# Altium footprint library MyPcbLib.PcbLib: 657 footprints (part 8 of 42)
Each footprint in its own frame and in the unit in brackets; x right, y up, seen from the top. Pads: shape width x height; smd on the part's side, far side on the other; paste and mask are expansions set on the pad; w line width, h text height; cw(c..) or ccw(c..) is an arc to the next point about the centre after c.
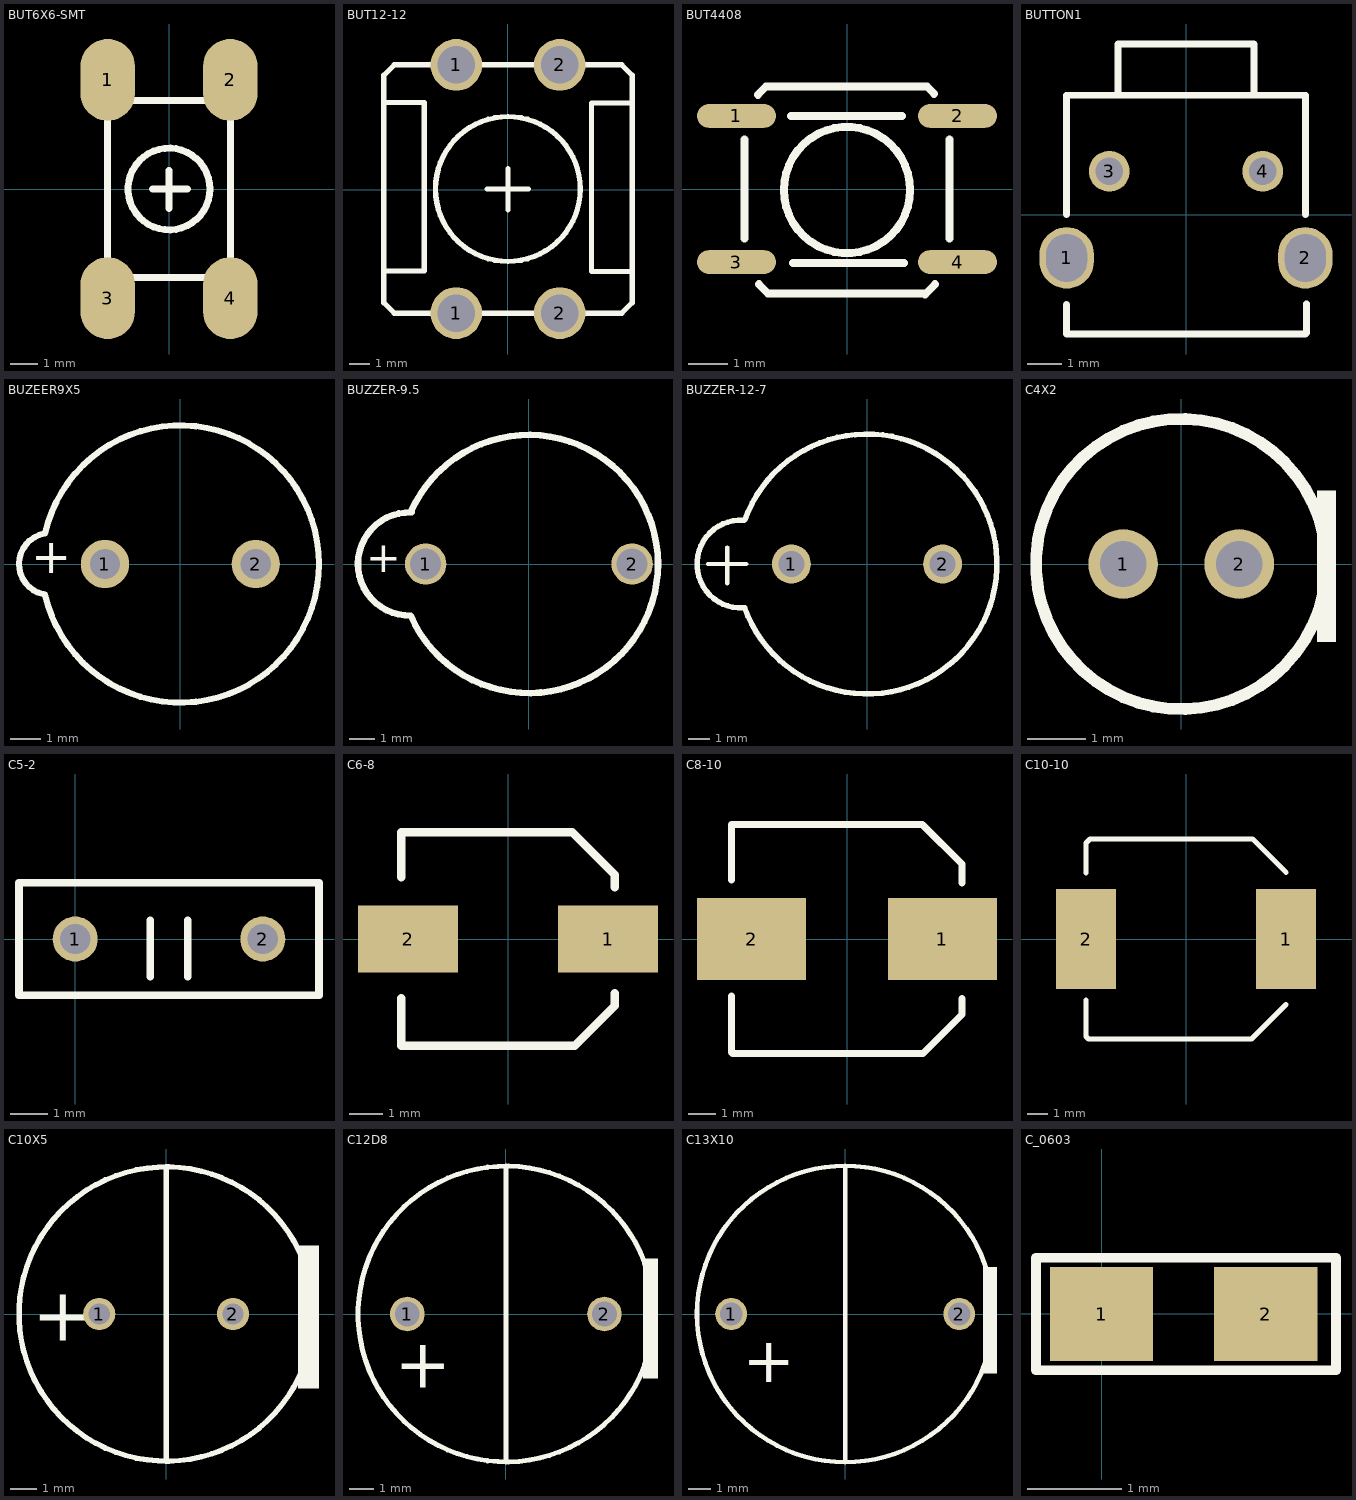
[diagram p7: the footprints below, top view; thin cyan lines are the x and y axes]

## BUT6X6-SMT [mm]
pads (4):
  oval 2x3 smd: 1(-2.25,4) 2(2.25,4) 3(-2.25,-4) 4(2.25,-4)
Top Overlay:
  circle w0.254: c0,0 r1.5
  lines w0.254: -0.599,0 0.671,0 ; 0,-0.71 0,0.687 ; -2.25,-3.25 -2.25,3.25 2.25,3.25 2.25,-3.25 -2.25,-3.25

## BUT12-12 [mm]
pads (4):
  round 2.5 hole 1.8: 1(-2.49,-5.97) 1(-2.49,6.03) 2(2.51,-5.97) 2(2.51,6.03)
Top Overlay:
  circle w0.254: c0.004,0.03 r3.5
  lines w0.254: -5.99,-3.938 -4.034,-3.938 -4.034,4.216 -5.939,4.216 -5.99,4.266 ; -0.996,0.025 0.004,0.025 ; 0.004,-0.975 0.004,0.025 ; 0.004,1.025 0.004,0.025 ; 1.004,0.025 0.004,0.025 ; 5.959,-3.963 4.043,-3.963 4.043,4.19 5.959,4.19 ; -5.99,-5.47 -5.49,-5.97 5.51,-5.97 6.01,-5.47 6.01,5.53 5.51,6.03 -5.49,6.03 -5.99,5.53 -5.99,-5.47
3D body: height 15.25, standoff -1.75, extent -5.949,-5.994 6.051,6.006

## BUT4408 [mm]
pads (4):
  oval 2x0.6 smd: 1(-2.8,1.85) 2(2.8,1.85) 3(-2.8,-1.85) 4(2.8,-1.85)
Top Overlay:
  circle w0.203: c0,-0.025 r1.6
  lines w0.203: -2.6,-1.25 -2.6,1.25 ; -2.261,2.388 -2.057,2.591 ; -2.235,-2.413 -2.007,-2.642 ; -2,-2.651 2,-2.651 ; -2,2.6 2,2.6 ; -1.422,1.854 1.397,1.854 ; -1.372,-1.88 1.448,-1.88 ; 1.981,-2.667 2.235,-2.413 ; 2.032,2.591 2.21,2.413 ; 2.6,-1.25 2.6,1.25

## BUTTON1 [mm]
pads (4):
  oval 1.6x1.8 hole 1.2 slot 1.4 at 90 deg: 1(-3.5,-1.27) 2(3.5,-1.27)
  round 1.2 hole 0.8: 3(-2.25,1.27) 4(2.25,1.27)
Top Overlay:
  lines w0.203: -3.505,-3.5 -3.505,-2.642 ; -3.5,-3.5 3.5,-3.5 ; -3.5,0 -3.5,3.5 3.5,3.5 3.5,0 ; -2,3.5 -2,5 2,5 2,3.519 ; 3.531,-3.48 3.531,-2.616
3D body: height 6, standoff -3, extent -2.949,0.334 3.051,5.334

## BUZEER9X5 [mm]
pads (2):
  round 1.6 hole 1: 1(-2.5,0) 2(2.5,0)
Top Overlay:
  lines w0.203: -4.549,-1.001 cw(c-4.327,0) -4.52,1.008 ; -4.485,-1.022 ccw(c0,0) -4.486,1.019
  text "+" at -4.953,-0.686 h2
3D body: height 5.05, standoff -1.6, extent -4.424,-4.403 4.576,4.597

## BUZZER-9.5 [mm]
pads (2):
  round 1.6 hole 1.2: 1(-4,0) 2(4,0)
Top Overlay:
  lines w0.254: -4.582,2.001 cw(c0,0) -4.575,-2.016 ; -4.572,-1.999 cw(c-4.623,0) -4.547,1.999
  text "+" at -6.299,-0.711 h2

## BUZZER-12-7 [mm]
pads (2):
  round 1.8 hole 1.2: 1(-3.5,0) 2(3.5,0)
Top Overlay:
  lines w0.203: -7.366,0 -5.588,0 ; -6.477,-0.889 -6.477,0.762
  lines w0.254: -5.722,-2.032 cw(c-5.842,0) -5.715,2.032 ; -5.676,-2.018 ccw(c0,0) -5.661,2.059
3D body: height 10.05, standoff -4, extent -6.076,-5.969 5.924,6.031

## C4X2 [mm]
pads (2):
  round 1.2 hole 0.8: 1(-1,0) 2(1,0)
Top Overlay:
  circle w0.203: c0,0 r2.5
  rectangle: 2.337,-1.346 2.667,1.27

## C5-2 [mm]
pads (2):
  round 1.2 hole 0.8: 1(0,0) 2(5,0)
Top Overlay:
  lines w0.203: 2,-1 2,0.5 ; 3,-1 3,0.5 ; -1.5,-1.5 -1.5,1.5 6.5,1.5 6.5,-1.5 -1.5,-1.5

## C6-8 [mm]
pads (2):
  rect 3x2 smd: 1(3,0) 2(-3,0)
Top Overlay:
  lines w0.254: -3.2,-3.2 2.007,-3.2 3.2,-2.007 ; -3.2,-3.175 -3.2,-1.778 ; -3.2,1.854 -3.2,3.15 ; -3.2,3.2 1.931,3.2 3.2,1.931 3.2,1.549 ; 3.2,-1.956 3.2,-1.626

## C8-10 [mm]
pads (2):
  rect 4x3 smd: 1(3.5,0) 2(-3.5,0)
Top Overlay:
  lines w0.254: -4.242,-4.166 -4.242,-2.083 ; -4.242,2.159 -4.242,4.191 ; -4.2,-4.2 2.785,-4.2 4.216,-2.769 ; -4.2,4.2 2.76,4.2 4.216,2.743 ; 4.216,-2.743 4.216,-2.184 ; 4.216,2.057 4.216,2.718

## C10-10 [mm]
pads (2):
  rect 3x5 smd: 1(5,0) 2(-5,0)
Top Overlay:
  lines w0.254: -5,-3.048 -5,-4.881 -4.881,-5 3.28,-5 5,-3.28 ; -5,3.302 -5,4.804 -4.804,5 3.331,5 5,3.331

## C10X5 [mm]
pads (2):
  round 1.2 / inner round 1.2 / far side round 1.8 hole 0.8: 1(-2.5,0) 2(2.5,0)
Top Overlay:
  circle w0.203: c0,0 r5.5
  rectangle: 4.928,-2.794 5.715,2.565
  lines w0.203: 0,-5.5 0,5.5
  text "+" at -5,-1 h2

## C12D8 [mm]
pads (2):
  round 1.4 hole 1: 1(-4,0) 2(4,0)
Top Overlay:
  circle w0.203: c0,0 r6
  rectangle: 5.563,-2.616 6.172,2.261
  lines w0.203: 0,-6 0,6
  text "+" at -4.5,-3 h2

## C13X10 [mm]
pads (2):
  round 1.4 / inner round 1.4 / far side round 2 hole 1: 1(-5,0) 2(5,0)
Top Overlay:
  circle w0.203: c0,0 r6.5
  rectangle: 6.045,-2.616 6.655,2.057
  lines w0.203: 0,-6.5 0,6.5
  text "+" at -4.5,-3 h2

## C_0603 [mm]
pads (2):
  rect 1.1x1 smd: 1(-0.002,0) 2(1.748,0)
Top Overlay:
  lines w0.102: -0.702,-0.6 2.498,-0.6 2.498,0.6 -0.702,0.6 -0.702,-0.6